# Altium footprint library CPU_STM_080816.PcbLib: 220 footprints (part 9 of 16)
Each footprint in its own frame and in the unit in brackets; x right, y up, seen from the top. Pads: shape width x height; smd on the part's side, far side on the other; paste and mask are expansions set on the pad; w line width, h text height; cw(c..) or ccw(c..) is an arc to the next point about the centre after c.
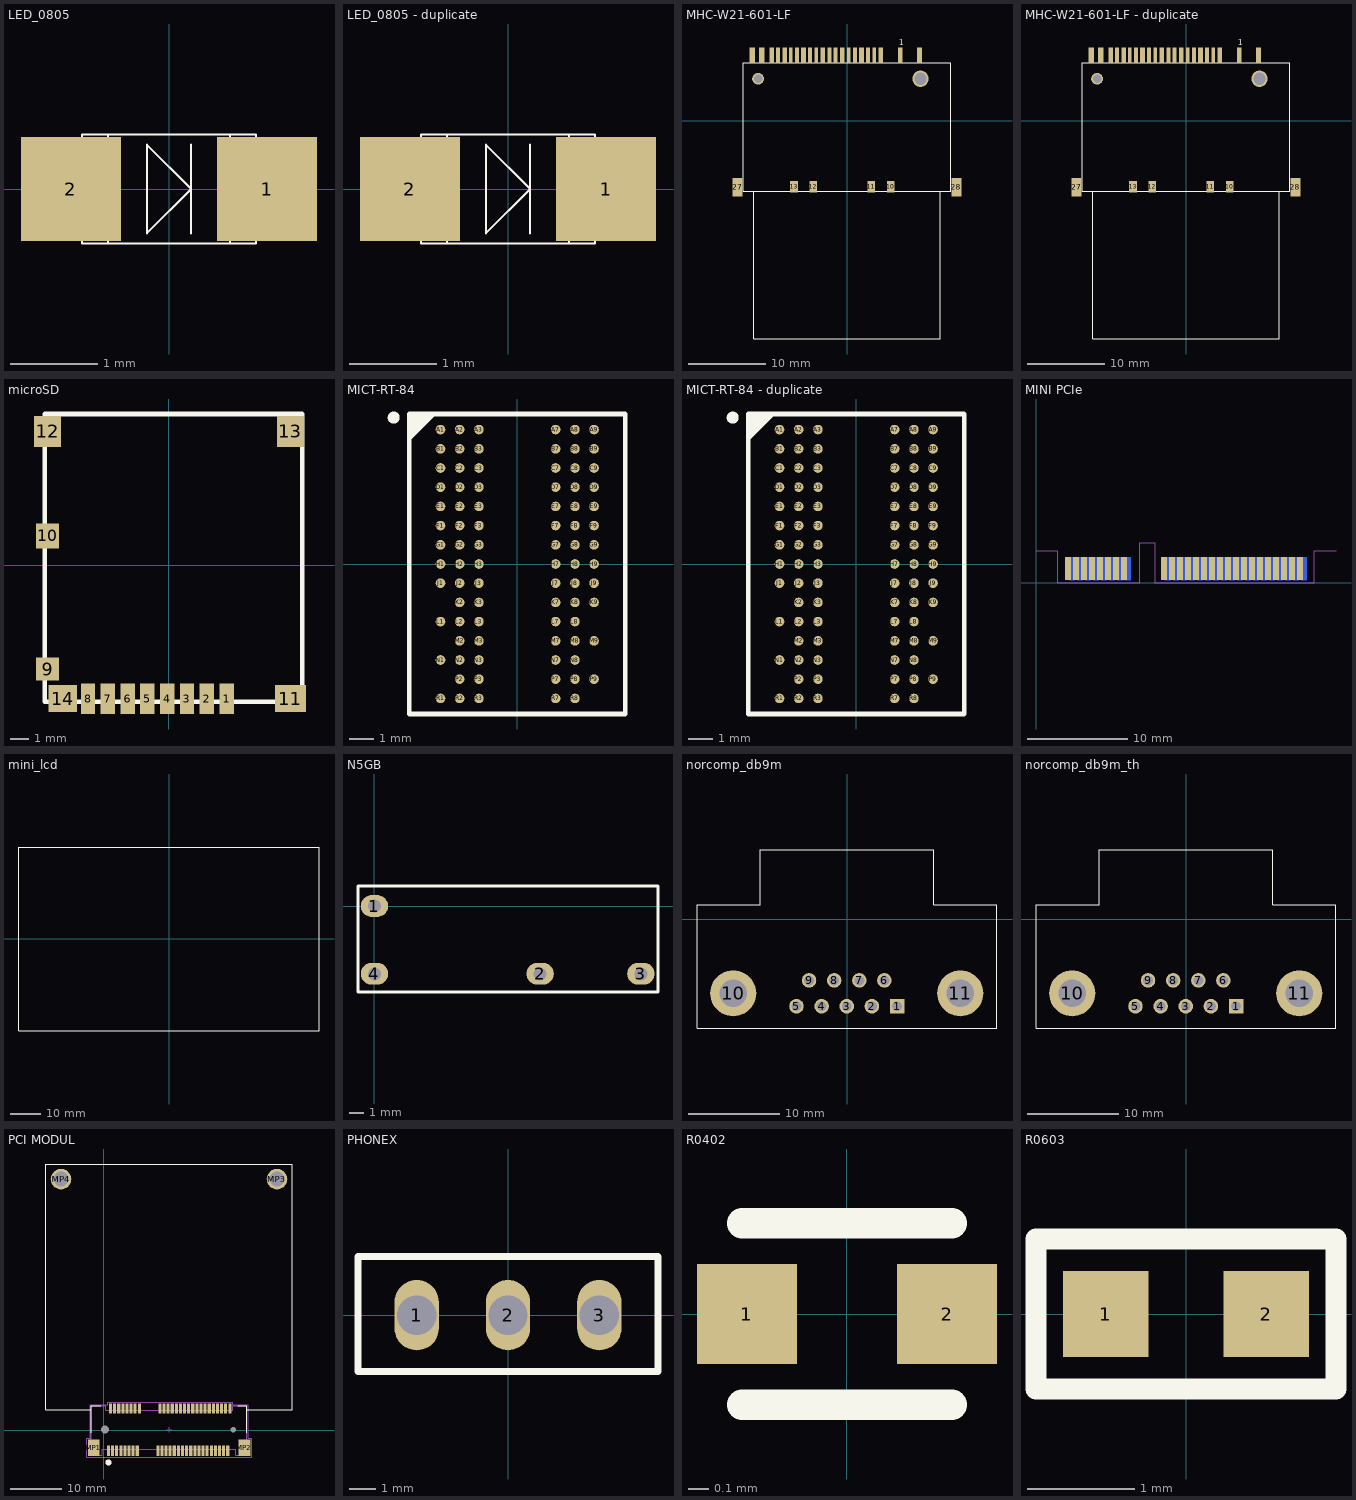
[diagram p8: the footprints below, top view; thin cyan lines are the x and y axes]

## LED_0805 [mil]
pads (2):
  rect 45.28x47 smd: 1(44.29,0) 2(-44.29,0)
Top Overlay:
  lines w1: 10,-20 10,20 ; -39.37,-24.61 39.37,-24.61 39.37,24.61 -39.37,24.61 -39.37,-24.61 ; -27.56,-24.61 27.56,-24.61 27.56,24.61 -27.56,24.61 -27.56,-24.61 ; -10,-20 -10,20 10,0 -10,-20
3D body "User Library-LED SMD0805.step": height 33.45, standoff 0.23, extent -40.6,-15 40.6,20.68

## LED_0805 - duplicate [mil]
pads (2):
  rect 45.28x47 smd: 1(44.29,0) 2(-44.29,0)
Top Overlay:
  lines w1: 10,-20 10,20 ; -39.37,-24.61 -39.37,24.61 39.37,24.61 39.37,-24.61 -39.37,-24.61 ; -27.56,-24.61 -27.56,24.61 27.56,24.61 27.56,-24.61 -27.56,-24.61 ; -10,-20 10,0 -10,20 -10,-20

## MHC-W21-601-LF [mm] "MHC-W21-601-LF"
pads (30):
  rect 0.6x2 smd: 1(6.875,8.5) 2(4.375,8.5) 3(1.875,8.5) 4(-0.625,8.5) 5(-3.125,8.5) 6(-5.625,8.5) 7(-8.05,8.5) 8(-9.75,8.5) 9(9.375,8.5)
  rect 1x1.5 smd: 10(5.65,-8.5) 11(3.15,-8.5) 12(-4.35,-8.5) 13(-6.85,-8.5)
  rect 0.7x2 smd: 14(-12.25,8.5) 15(-11.05,8.5)
  rect 0.5x2 smd: 16(-7.27,8.5) 17(-6.475,8.5) 18(-4.775,8.5) 19(-1.475,8.5) 20(0.225,8.5) 21(1.025,8.5) 22(2.725,8.5) 23(3.525,8.5) 24(-8.9,8.5) 25(-3.975,8.5) 26(-2.275,8.5)
  rect 1.3x2.4 smd: 27(-14.15,-8.55) 28(14.15,-8.55)
  round 1.524 hole 1.092: " "(-11.5,5.45)
  round 2.108 hole 1.6: " "(9.5,5.45)
Top Overlay:
  lines w0.025: -13.4,-9.1 13.4,-9.1 13.4,7.5 -13.4,7.5 -13.4,-9.1 ; -12.05,-28.2 12.05,-28.2 12.05,-9.1 -12.05,-9.1 -12.05,-28.2
  text "1" at 6.706,9.804 h0.79
Multi-Layer:
  region: -7.65,-6.75 -7.65,-3.75 -3.55,-3.75 -3.55,-6.75
  region: 2.35,-6.75 2.35,-3.75 6.45,-3.75 6.45,-6.75

## MHC-W21-601-LF - duplicate [mm] "MHC-W21-601-LF"
pads (30):
  rect 0.6x2 smd: 1(6.875,8.5) 2(4.375,8.5) 3(1.875,8.5) 4(-0.625,8.5) 5(-3.125,8.5) 6(-5.625,8.5) 7(-8.05,8.5) 8(-9.75,8.5) 9(9.375,8.5)
  rect 1x1.5 smd: 10(5.65,-8.5) 11(3.15,-8.5) 12(-4.35,-8.5) 13(-6.85,-8.5)
  rect 0.7x2 smd: 14(-12.25,8.5) 15(-11.05,8.5)
  rect 0.5x2 smd: 16(-7.27,8.5) 17(-6.475,8.5) 18(-4.775,8.5) 19(-1.475,8.5) 20(0.225,8.5) 21(1.025,8.5) 22(2.725,8.5) 23(3.525,8.5) 24(-8.9,8.5) 25(-3.975,8.5) 26(-2.275,8.5)
  rect 1.3x2.4 smd: 27(-14.15,-8.55) 28(14.15,-8.55)
  round 1.524 hole 1.092: " "(-11.5,5.45)
  round 2.108 hole 1.6: " "(9.5,5.45)
Top Overlay:
  lines w0.025: -13.4,-9.1 13.4,-9.1 13.4,7.5 -13.4,7.5 -13.4,-9.1 ; -12.05,-28.2 12.05,-28.2 12.05,-9.1 -12.05,-9.1 -12.05,-28.2
  text "1" at 6.706,9.804 h0.79
Multi-Layer:
  region: -7.65,-6.75 -7.65,-3.75 -3.55,-3.75 -3.55,-6.75
  region: 2.35,-6.75 2.35,-3.75 6.45,-3.75 6.45,-6.75

## microSD [mm] "Molex-5027740891"
pads (14):
  rect 0.8x1.68 smd: 1(3.2,-7.425) 2(2.1,-7.425) 3(1,-7.425) 4(-0.1,-7.425) 5(-1.2,-7.425) 6(-2.3,-7.425) 7(-3.4,-7.425) 8(-4.5,-7.425)
  rect 1.29x1.3 smd: 9(-6.75,-5.775)
  rect 1.29x1.4 smd: 10(-6.75,1.625)
  rect 1.7x1.5 smd: 11(6.75,-7.425)
  rect 1.5x1.7 smd: 12(-6.75,7.425) 13(6.75,7.425)
  rect 1.6x1.5 smd: 14(-5.91,-7.425)
Top Overlay:
  lines w0.254: -6.9,-7.603 -6.9,8.397 7.4,8.397 7.4,-7.603 -6.9,-7.603
3D body "5027740891.stp": height 2.13, standoff 0.33, extent -6.9,-7.603 7.4,8.397

## MICT-RT-84 [mm] "BGA, 84-Balls, Body 12.5x9mm, Pitch 0.8mm"
pads (84):
  round 0.4 smd: A1(-3.2,5.6) A2(-2.4,5.6) A3(-1.6,5.6) A7(1.6,5.6) A8(2.4,5.6) A9(3.2,5.6) B1(-3.2,4.8) B2(-2.4,4.8) B3(-1.6,4.8) B7(1.6,4.8) B8(2.4,4.8) B9(3.2,4.8) C1(-3.2,4) C2(-2.4,4) C3(-1.6,4) C7(1.6,4) C8(2.4,4) C9(3.2,4) D1(-3.2,3.2) D2(-2.4,3.2) D3(-1.6,3.2) D7(1.6,3.2) D8(2.4,3.2) D9(3.2,3.2) E1(-3.2,2.4) E2(-2.4,2.4) E3(-1.6,2.4) E7(1.6,2.4) E8(2.4,2.4) E9(3.2,2.4) F1(-3.2,1.6) F2(-2.4,1.6) F3(-1.6,1.6) F7(1.6,1.6) F8(2.4,1.6) F9(3.2,1.6) G1(-3.2,0.8) G2(-2.4,0.8) G3(-1.6,0.8) G7(1.6,0.8) G8(2.4,0.8) G9(3.2,0.8) H1(-3.2,0) H2(-2.4,0) H3(-1.6,0) H7(1.6,0) H8(2.4,0) H9(3.2,0) J1(-3.2,-0.8) J2(-2.4,-0.8) J3(-1.6,-0.8) J7(1.6,-0.8) J8(2.4,-0.8) J9(3.2,-0.8) K2(-2.4,-1.6) K3(-1.6,-1.6) K7(1.6,-1.6) K8(2.4,-1.6) K9(3.2,-1.6) L1(-3.2,-2.4) L2(-2.4,-2.4) L3(-1.6,-2.4) L7(1.6,-2.4) L8(2.4,-2.4) M2(-2.4,-3.2) M3(-1.6,-3.2) M7(1.6,-3.2) M8(2.4,-3.2) M9(3.2,-3.2) N1(-3.2,-4) N2(-2.4,-4) N3(-1.6,-4) N7(1.6,-4) N8(2.4,-4) P2(-2.4,-4.8) P3(-1.6,-4.8) P7(1.6,-4.8) P8(2.4,-4.8) P9(3.2,-4.8) R1(-3.2,-5.6) R2(-2.4,-5.6) R3(-1.6,-5.6) R7(1.6,-5.6) R8(2.4,-5.6)
Top Overlay:
  circle w0.25: c-5.15,6.1 r0.125
  region: -3.5,6.25 -4.5,5.25 -4.5,6.25
  lines w0.2: -4.5,5.25 -3.5,6.25 ; -4.5,-6.25 -4.5,6.25 4.5,6.25 4.5,-6.25 -4.5,-6.25

## MICT-RT-84 - duplicate [mm] "BGA, 84-Balls, Body 12.5x9mm, Pitch 0.8mm"
pads (84):
  round 0.4 smd: A1(-3.2,5.6) A2(-2.4,5.6) A3(-1.6,5.6) A7(1.6,5.6) A8(2.4,5.6) A9(3.2,5.6) B1(-3.2,4.8) B2(-2.4,4.8) B3(-1.6,4.8) B7(1.6,4.8) B8(2.4,4.8) B9(3.2,4.8) C1(-3.2,4) C2(-2.4,4) C3(-1.6,4) C7(1.6,4) C8(2.4,4) C9(3.2,4) D1(-3.2,3.2) D2(-2.4,3.2) D3(-1.6,3.2) D7(1.6,3.2) D8(2.4,3.2) D9(3.2,3.2) E1(-3.2,2.4) E2(-2.4,2.4) E3(-1.6,2.4) E7(1.6,2.4) E8(2.4,2.4) E9(3.2,2.4) F1(-3.2,1.6) F2(-2.4,1.6) F3(-1.6,1.6) F7(1.6,1.6) F8(2.4,1.6) F9(3.2,1.6) G1(-3.2,0.8) G2(-2.4,0.8) G3(-1.6,0.8) G7(1.6,0.8) G8(2.4,0.8) G9(3.2,0.8) H1(-3.2,0) H2(-2.4,0) H3(-1.6,0) H7(1.6,0) H8(2.4,0) H9(3.2,0) J1(-3.2,-0.8) J2(-2.4,-0.8) J3(-1.6,-0.8) J7(1.6,-0.8) J8(2.4,-0.8) J9(3.2,-0.8) K2(-2.4,-1.6) K3(-1.6,-1.6) K7(1.6,-1.6) K8(2.4,-1.6) K9(3.2,-1.6) L1(-3.2,-2.4) L2(-2.4,-2.4) L3(-1.6,-2.4) L7(1.6,-2.4) L8(2.4,-2.4) M2(-2.4,-3.2) M3(-1.6,-3.2) M7(1.6,-3.2) M8(2.4,-3.2) M9(3.2,-3.2) N1(-3.2,-4) N2(-2.4,-4) N3(-1.6,-4) N7(1.6,-4) N8(2.4,-4) P2(-2.4,-4.8) P3(-1.6,-4.8) P7(1.6,-4.8) P8(2.4,-4.8) P9(3.2,-4.8) R1(-3.2,-5.6) R2(-2.4,-5.6) R3(-1.6,-5.6) R7(1.6,-5.6) R8(2.4,-5.6)
Top Overlay:
  circle w0.25: c-5.15,6.1 r0.125
  region: -3.5,6.25 -4.5,5.25 -4.5,6.25
  lines w0.2: -4.5,5.25 -3.5,6.25 ; -4.5,-6.25 4.5,-6.25 4.5,6.25 -4.5,6.25 -4.5,-6.25

## MINI PCIe [mm]
pads (52):
  rect 0.6x2.3 smd paste-0.9: 1(3.2,1.4) 3(4,1.4) 5(4.8,1.4) 7(5.6,1.4) 9(6.4,1.4) 11(7.2,1.4) 13(8,1.4) 15(8.8,1.4) 17(12.8,1.4) 19(13.6,1.4) 21(14.4,1.4) 23(15.2,1.4) 25(16,1.4) 27(16.8,1.4) 29(17.6,1.4) 31(18.4,1.4) 33(19.2,1.4) 35(20,1.4) 37(20.8,1.4) 39(21.6,1.4) 41(22.4,1.4) 43(23.2,1.4) 45(24,1.4) 47(24.8,1.4) 49(25.6,1.4) 51(26.4,1.4)
  rect 0.6x2.3 smd far side paste-0.9: 2(3.6,1.4) 4(4.4,1.4) 6(5.2,1.4) 8(6,1.4) 10(6.8,1.4) 12(7.6,1.4) 14(8.4,1.4) 16(9.2,1.4) 18(13.2,1.4) 20(14,1.4) 22(14.8,1.4) 24(15.6,1.4) 26(16.4,1.4) 28(17.2,1.4) 30(18,1.4) 32(18.8,1.4) 34(19.6,1.4) 36(20.4,1.4) 38(21.2,1.4) 40(22,1.4) 42(22.8,1.4) 44(23.6,1.4) 46(24.4,1.4) 48(25.2,1.4) 50(26,1.4) 52(26.8,1.4)
Top Solder:
  rectangle: 1.9,-0.25 28.1,2.675
Bottom Solder:
  rectangle: 1.9,-0.25 28.1,2.675
Mechanical 1:
  lines w0.1: 0,3.2 2.108,3.2 cw(c2.108,3.158) 2.15,3.158 2.15,0 10.4,0 10.4,3.25 10.4,3.988 ; 10.411,3.988 11.9,3.988 11.9,3.975 11.9,3.25 11.9,0 27.85,0 27.85,3.2 30,3.2

## mini_lcd [mm]
Top Overlay:
  lines w0.2: -49.1,-30.1 48.9,-30.1 48.9,29.9 -49.1,29.9 -49.1,-30.1
3D body "WH2004A-YYH-ET.STEP": height 31.6, standoff 21, extent -49.1,-30.1 48.9,29.9

## N5GB [mm]
pads (4):
  oval 1.9x1.524 hole 0.9: 1(0,0) 2(11.5,-4.7) 3(18.5,-4.7) 4(0,-4.7)
Top Overlay:
  lines w0.2: -1.143,-5.969 19.685,-5.969 19.685,1.397 -1.143,1.397 -1.143,0.473 -1.143,-1.778 -1.143,-5.969
3D body "g5nb-1a-e_24dc.stp": height 15.3, standoff -3.4, extent -1.016,-5.886 19.484,1.314

## norcomp_db9m [mil] "NORCOMP_DB9M_TH"
pads (11):
  rect 63x63 hole 43: 1(215,-378)
  round 63 hole 43: 2(106,-378) 3(-3,-378) 4(-112,-378) 5(-221,-378) 6(160,-266) 7(51.5,-266) 8(-57.5,-266) 9(-166.5,-266)
  round 200 hole 120: 10(-495,-322) 11(489,-322)
Top Overlay:
  lines w1: -652,-474 648,-474 648,61 373,61 373,301 -377,301 -377,61 -652,61 -652,-474
3D body "dsub.stp": height 476.45, standoff -78.74, extent -613.26,-564.48 603.27,-75.5

## norcomp_db9m_th [mil] "NORCOMP_DB9M_TH"
pads (11):
  rect 63x63 hole 43: 1(215,-378)
  round 63 hole 43: 2(106,-378) 3(-3,-378) 4(-112,-378) 5(-221,-378) 6(160,-266) 7(51.5,-266) 8(-57.5,-266) 9(-166.5,-266)
  round 200 hole 120: 10(-495,-322) 11(489,-322)
Top Overlay:
  lines w1: -652,-474 -652,61 -377,61 -377,301 373,301 373,61 648,61 648,-474 -652,-474
3D body "User Library-DB9-SUB.step": height 522.64, standoff -141.73, extent -609.46,-441.93 603.54,278.54

## PCI MODUL [mm]
pads (58):
  rect 0.6x2 smd mask+0.06: 1(0.876,-4.004) 2(1.276,4.196) 3(1.676,-4.004) 4(2.076,4.196) 5(2.476,-4.004) 6(2.876,4.196) 7(3.276,-4.004) 8(3.676,4.196) 9(4.076,-4.004) 10(4.476,4.196) 11(4.876,-4.004) 12(5.276,4.196) 13(5.676,-4.004) 14(6.076,4.196) 15(6.476,-4.004) 16(6.876,4.196) 17(10.476,-4.004) 18(10.876,4.196) 19(11.276,-4.004) 20(11.676,4.196) 21(12.076,-4.004) 22(12.476,4.196) 23(12.876,-4.004) 24(13.276,4.196) 25(13.676,-4.004) 26(14.076,4.196) 27(14.476,-4.004) 28(14.876,4.196) 29(15.276,-4.004) 30(15.676,4.196) 31(16.076,-4.004) 32(16.476,4.196) 33(16.876,-4.004) 34(17.276,4.196) 35(17.676,-4.004) 36(18.076,4.196) 37(18.476,-4.004) 38(18.876,4.196) 39(19.276,-4.004) 40(19.676,4.196) 41(20.076,-4.004) 42(20.476,4.196) 43(20.876,-4.004) 44(21.276,4.196) 45(21.676,-4.004) 46(22.076,4.196) 47(22.476,-4.004) 48(22.876,4.196) 49(23.276,-4.004) 50(23.676,4.196) 51(24.076,-4.004) 52(24.476,4.196)
  round 1.3 hole 1.6 unplated mask+0.06: MH1(0.176,0.096)
  round 0.8 hole 1.1 unplated mask+0.06: MH2(25.176,0.096)
  rect 2.3x3.2 smd mask+0.06: MP1(-1.974,-3.404) MP2(27.326,-3.404)
  round 4 hole 2.9: MP3(33.649,48.804) MP4(-8.351,48.804)
Top Overlay:
  circle w0.6: c0.86,-6.291 r0.3
  lines w0.2: -2.453,4.004 -11.352,4.004 -11.352,51.755 36.649,51.755 ; -2.449,-0.537 -2.449,4.696 -2.231,4.696 -0.662,4.696 ; 26.005,4.696 27.801,4.696 ; 27.801,-0.548 27.801,4.631 ; 27.801,4 36.646,4 36.649,4.003 36.649,51.754 ; 36.649,51.755 36.649,51.754
Mechanical 13:
  lines w0.1: -2.449,-3.704 -1.349,-3.704 ; -2.449,-3.702 -2.449,4.696 -2.231,4.696 0.301,4.696 ; -1.351,-4.904 -0.324,-4.904 -0.324,-3.704 25.676,-3.704 25.676,-4.904 26.686,-4.904 26.701,-4.889 26.701,-3.708 ; -1.349,-4.904 -1.349,-3.726 ; 0.301,3.895 0.301,4.696 ; 0.301,3.896 25.051,3.896 25.051,4.697 27.801,4.696 27.801,4.631 27.801,-3.7 ; 26.701,-3.704 27.801,-3.704
Mechanical 15:
  lines w0.1: 12.176,0.096 13.176,0.096 ; 12.676,-0.404 12.676,0.596 ; -3.374,-5.254 28.726,-5.254 28.726,-1.554 28.051,-1.554 28.051,4.946 25.026,4.946 25.026,5.446 0.726,5.446 0.726,4.946 -2.699,4.946 -2.699,-1.554 -3.374,-1.554 -3.374,-5.254
3D body: height 0.82, standoff 0.2, extent 25.026,3.896 27.676,4.596
3D body: height 0.82, standoff 0.2, extent 27.676,4.596 27.676,4.596
3D body: height 0.82, standoff 0.2, extent -2.324,3.796 0.326,4.596
3D body: height 1.34, standoff 0.69, extent 24.776,-4.154 26.466,-3.604
3D body: height 1.34, standoff 0.69, extent -1.114,-4.154 0.576,-3.604
3D body: height 5.6, standoff 4.54, extent -1.114,-4.904 0.576,-3.604
3D body: height 5.6, standoff 4.54, extent 24.776,-4.904 26.466,-3.604
3D body "CPU_MOD1.STEP": height 7.2, standoff -0.79, extent -11.352,-4.699 36.65,51.755

## PHONEX [mm]
pads (3):
  oval 1.7x2.7 hole 1.5: 1(-3.5,0) 2(0,0) 3(3.5,0)
Top Overlay:
  lines w0.254: -5.75,-2.159 -5.75,0 -5.75,2.251 5.75,2.251 5.75,0 5.75,-2.159 -5.75,-2.159
3D body "1844223.stp": height 7.25, standoff -3.4, extent -5.925,-1.225 5.975,7.975

## R0402 [mm]
pads (2):
  rect 0.5x0.5 smd: 1(-0.5,0) 2(0.5,0)
Top Overlay:
  lines w0.152: -0.525,-0.453 0.525,-0.453 ; -0.525,0.453 0.525,0.453
3D body "User Library-RES_1005-0402.step": height 0.41, standoff 0, extent -0.575,-0.277 0.575,0.273

## R0603 [mm]
pads (2):
  rect 0.8x0.8 smd: 1(-0.75,0) 2(0.75,0)
Top Overlay:
  lines w0.2: -1.4,-0.7 -1.4,0.7 1.4,0.7 1.4,-0.7 -1.4,-0.7
3D body "User Library-RES_1609-0603.step": height 0.56, standoff 0, extent -0.85,-0.4 0.85,0.4